# Altium footprint library 常用元件封装库.PcbLib: 1310 footprints (part 56 of 83)
Each footprint in its own frame and in the unit in brackets; x right, y up, seen from the top. Pads: shape width x height; smd on the part's side, far side on the other; paste and mask are expansions set on the pad; w line width, h text height; cw(c..) or ccw(c..) is an arc to the next point about the centre after c.
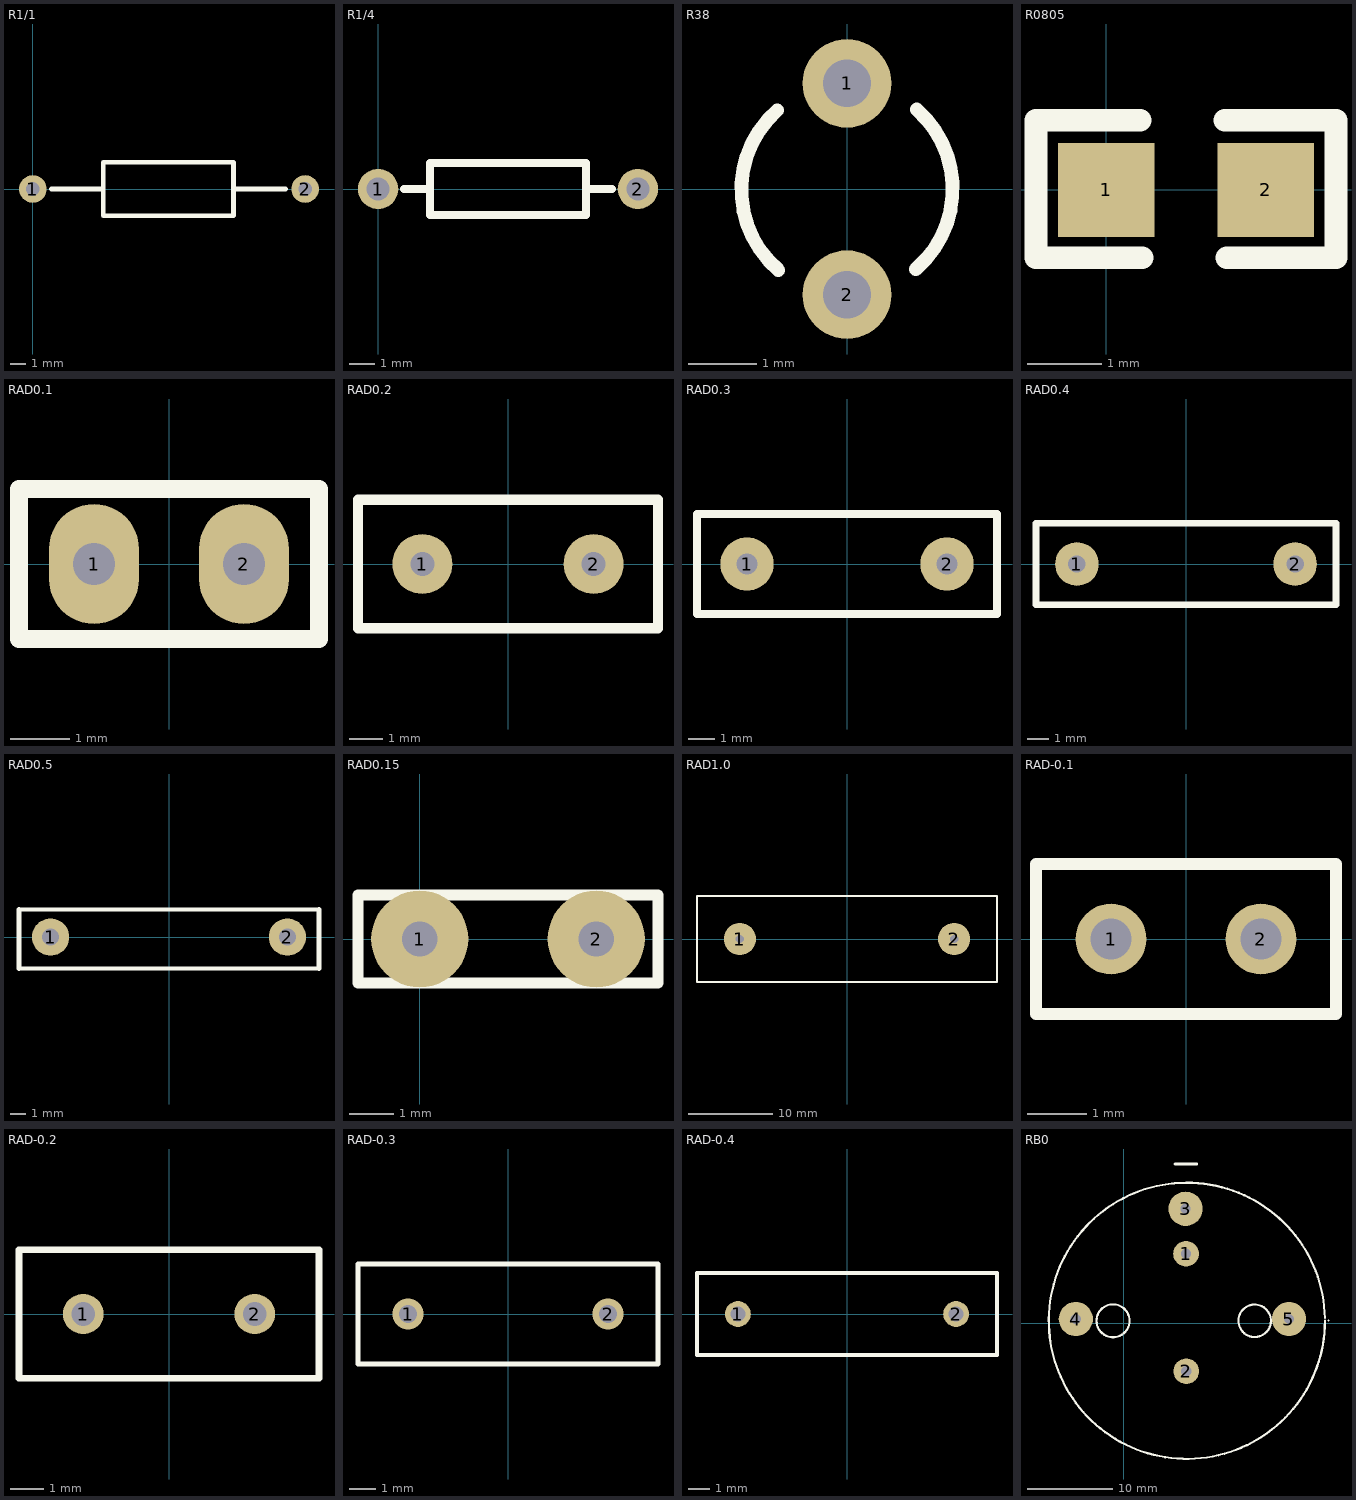
[diagram p55: the footprints below, top view; thin cyan lines are the x and y axes]

## R1/1 [mm]
pads (2):
  round 1.8 hole 0.9: 1(0,0) 2(17.78,0)
Top Overlay:
  lines w0.305: 1.2,0 4.6,0 ; 4.6,-1.75 4.6,1.75 13.1,1.75 13.1,-1.75 4.7,-1.75 ; 13.1,0 16.5,0

## R1/4 [mil]
pads (2):
  round 62 hole 35.43: 1(0,0) 2(400,0)
Top Overlay:
  lines w12: 40,0 80,0 ; 320,0 360,0 ; 80,-40 80,40 320,40 320,-40 80,-40

## R38 [mm] "Crystal, Thru-Hole; 2 Leads; Body 3.1 x 8.2 mm (Dia.xH)"
height 8.2
pads (2):
  round 1.3 hole 0.7: 1(0,1.55) 2(0,-1.55)
Top Overlay:
  lines w0.2: -1.022,1.155 ccw(c0,-0.01) -1.006,-1.189 ; 1.006,-1.179 ccw(c0,0) 1.022,1.165

## R0805 [mm]
pads (2):
  rect 1.3x1.27 smd: 1(0,0) 2(2.15,0)
Top Overlay:
  lines w0.305: 0.457,0.94 -0.95,0.94 -0.95,-0.914 0.483,-0.914 ; 1.6,0.94 3.1,0.94 3.1,-0.914 1.626,-0.914
3D body "User Library-RES_2013-0805.STEP": height 0.76, standoff 0, extent -0.083,-0.7 2.217,0.65

## RAD0.1 [mil]
pads (2):
  oval 60x80 hole 28: 1(-50,0) 2(50,0)
Top Overlay:
  lines w12: -100,-50 100,-50 100,50 -100,50 -100,-50

## RAD0.2 [mil]
pads (2):
  round 70 hole 28: 1(-100,0) 2(100,0)
Top Overlay:
  lines w12: -175,-75 175,-75 175,75 -175,75 -175,-75

## RAD0.3 [mil]
pads (2):
  round 80 hole 32: 1(-150,0) 2(150,0)
Top Overlay:
  lines w12: -225,-75 225,-75 225,75 -225,75 -225,-75

## RAD0.4 [mil]
pads (2):
  round 80 hole 32: 1(-200,0) 2(200,0)
Top Overlay:
  lines w12: -275,-75 275,-75 275,75 -275,75 -275,-75

## RAD0.5 [mm]
pads (2):
  round 2.4 hole 1.1: 1(-7.62,0) 2(7.62,0)
Top Overlay:
  lines w0.254: -9.652,-2.032 9.652,-2.032 ; -9.652,1.778 9.652,1.778
  lines w0.305: -9.652,-2.032 -9.652,1.778 ; 9.652,-2.032 9.652,1.778

## RAD0.15 [mm]
pads (2):
  round 2.2 hole 0.8: 1(0,0) 2(4,0)
Top Overlay:
  lines w0.254: 4,-1 5.4,-1 5.4,1 5.2,1 4.2,1 ; 4.4,-1 -0.2,-1 -1.4,-1 -1.4,1 4.4,1

## RAD1.0 [mil]
pads (2):
  round 150 hole 39: 1(-500,0) 2(500,0)
Top Overlay:
  lines w10: -700,-200 -500,-200 500,-200 700,-200 700,200 500,200 -500,200 -700,200 -700,-200

## RAD-0.1 [mm] "Indicating Instrument; 2 Leads"
pads (2):
  round 1.2 hole 0.7: 1(-1.27,0) 2(1.27,0)
Top Overlay:
  lines w0.2: -2.54,-1.27 2.54,-1.27 2.54,1.27 -2.54,1.27 -2.54,-1.27

## RAD-0.2 [mm] "Jumper Wire; 2 Leads"
pads (2):
  round 1.2 hole 0.7: 1(-2.54,0) 2(2.54,0)
Top Overlay:
  lines w0.2: -4.445,-1.905 -4.445,1.905 4.445,1.905 4.445,-1.905 -4.445,-1.905

## RAD-0.3 [mm] "Capacitor; 2 Leads"
height 6
pads (2):
  round 1.2 hole 0.7: 1(-3.81,0) 2(3.81,0)
Top Overlay:
  lines w0.2: -5.715,-1.905 -5.715,1.905 5.715,1.905 5.715,-1.905 -5.715,-1.905

## RAD-0.4 [mm] "Servo Motor; 2 Leads"
pads (2):
  round 1.2 hole 0.7: 1(-5.08,0) 2(5.08,0)
Top Overlay:
  lines w0.2: -6.985,-1.905 6.985,-1.905 6.985,1.905 -6.985,1.905 -6.985,-1.905

## RB0 [mm]
pads (5):
  round 3 hole 1.2: 1(7.283,8.128) 2(7.312,-5.588)
  round 4 hole 1.2: 3(7.229,13.383) 4(-5.588,0.508) 5(19.304,0.508)
Top Overlay:
  circle w0.254: c-1.25,0.3 r1.923
  lines w0.254: 17.185,0.484 ccw(c15.3,0.3) 17.194,0.3 ; 23.498,0.62 ccw(c7.375,0.3) 23.501,0.3 ; 23.899,0.338 ccw(c7.275,0.2) 23.899,0.344
  lines w0.305: 5.996,18.612 8.536,18.612